# Altium footprint library ACTION_排针排座.PcbLib: 121 footprints (part 4 of 8)
Each footprint in its own frame and in the unit in brackets; x right, y up, seen from the top. Pads: shape width x height; smd on the part's side, far side on the other; paste and mask are expansions set on the pad; w line width, h text height; cw(c..) or ccw(c..) is an arc to the next point about the centre after c.
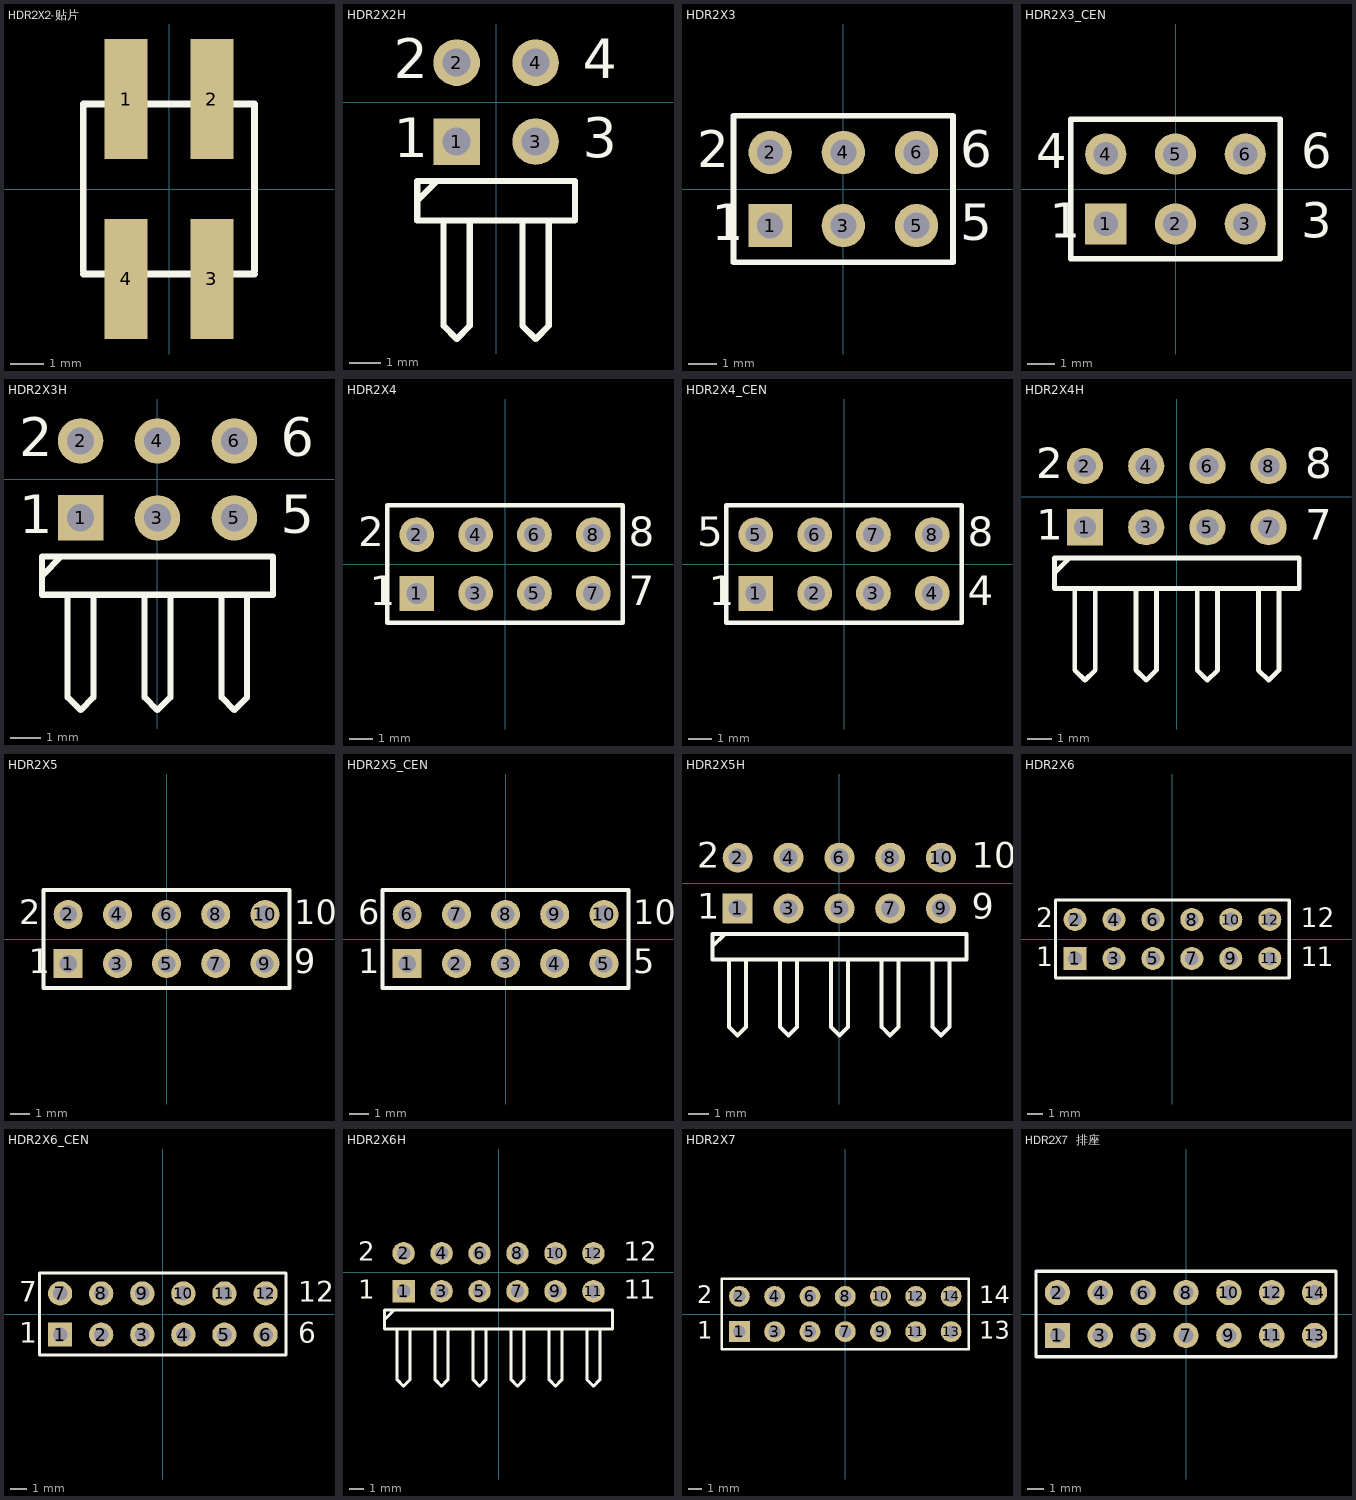
[diagram p3: the footprints below, top view; thin cyan lines are the x and y axes]

## HDR2X2-贴片 [mil]
pads (4):
  rect 50x140 smd: 1(-50,105) 2(50,105) 3(50,-105) 4(-50,-105)
Top Overlay:
  lines w7.87: -100.18,-99.24 99.82,-99.24 ; -100.18,-95.31 -100.18,4.69 ; -100.18,-0.82 -100.18,99.18 99.82,99.18 99.82,-0.82 ; 99.82,-95.31 99.82,4.69

## HDR2X2H [mm] "Connector; Header; 2x2 Position; Right Angle"
pads (4):
  rect 1.5x1.5 hole 0.9: 1(-1.27,-1.27)
  round 1.5 hole 0.9: 2(-1.27,1.27) 3(1.27,-1.27) 4(1.27,1.27)
Top Overlay:
  lines w0.2: -2.54,-3.175 -1.905,-2.54 ; -1.693,-3.81 -1.693,-7.197 -1.27,-7.62 -0.847,-7.197 -0.847,-3.81 ; 0.847,-3.81 0.847,-7.197 1.27,-7.62 1.693,-7.197 1.693,-3.81 ; -2.54,-3.81 2.54,-3.81 2.54,-2.54 -2.54,-2.54 -2.54,-3.81
  text "3" at 2.794,-1.778 h1.27
  text "4" at 2.794,0.762 h1.27
  text "2" at -3.302,0.762 h1.27
  text "1" at -3.302,-1.778 h1.27
3D body "12580.stp": height 5.55, standoff -3.22, extent -2.565,-11.831 2.515,1.524

## HDR2X3 [mm] "Connector; Header; 3x2 Position"
pads (6):
  rect 1.5x1.5 hole 0.9: 1(-2.54,-1.27)
  round 1.5 hole 0.9: 2(-2.54,1.27) 3(0,-1.27) 4(0,1.27) 5(2.54,-1.27) 6(2.54,1.27)
Top Overlay:
  lines w0.2: -1.058,-2.54 3.81,-2.54 ; 3.81,-2.54 -3.81,-2.54 -3.81,2.54 3.81,2.54 3.81,-2.54
  text "1" at -4.572,-1.778 h1.27
  text "2" at -5.08,0.762 h1.27
  text "5" at 4.064,-1.778 h1.27
  text "6" at 4.064,0.762 h1.27
3D body "HEADER 3X2.STEP": height 10.1, standoff -1.5, extent -3.835,-2.54 3.785,2.54

## HDR2X3_CEN [mm] "Connector; Header; 3x2 Position"
pads (6):
  rect 1.5x1.5 hole 0.9: 1(-2.54,-1.27)
  round 1.5 hole 0.9: 2(0,-1.27) 3(2.54,-1.27) 4(-2.54,1.27) 5(0,1.27) 6(2.54,1.27)
Top Overlay:
  lines w0.2: -3.81,-2.54 3.81,-2.54 3.81,2.54 -3.81,2.54 -3.81,-2.54
  text "6" at 4.572,0.762 h1.27
  text "3" at 4.572,-1.778 h1.27
  text "1" at -4.572,-1.778 h1.27
  text "4" at -5.08,0.762 h1.27
3D body "HEADER 3X2.STEP": height 10.1, standoff -1.5, extent -3.81,-2.54 3.81,2.54

## HDR2X3H [mm] "Connector; Header; 3x2 Position; Right Angle"
pads (6):
  rect 1.5x1.5 hole 0.9: 1(-2.54,-1.27)
  round 1.5 hole 0.9: 2(-2.54,1.27) 3(0,-1.27) 4(0,1.27) 5(2.54,-1.27) 6(2.54,1.27)
Top Overlay:
  lines w0.2: -3.81,-3.175 -3.175,-2.54 ; -2.963,-3.81 -2.963,-7.197 -2.54,-7.62 -2.117,-7.197 -2.117,-3.81 ; -0.423,-3.81 -0.423,-7.197 0,-7.62 0.423,-7.197 0.423,-3.81 ; 2.117,-3.81 2.117,-7.197 2.54,-7.62 2.963,-7.197 2.963,-3.81 ; -3.81,-3.81 3.81,-3.81 3.81,-2.54 -3.81,-2.54 -3.81,-3.81
  text "2" at -4.572,0.762 h1.27
  text "1" at -4.572,-1.778 h1.27
  text "5" at 4.064,-1.778 h1.27
  text "6" at 4.064,0.762 h1.27
3D body "12581.stp": height 5.55, standoff -3.22, extent -3.708,-11.881 3.912,1.474

## HDR2X4 [mm] "Connector; Header; 4x2 Position"
pads (8):
  rect 1.5x1.5 hole 0.9: 1(-3.81,-1.27)
  round 1.5 hole 0.9: 2(-3.81,1.27) 3(-1.27,-1.27) 4(-1.27,1.27) 5(1.27,-1.27) 6(1.27,1.27) 7(3.81,-1.27) 8(3.81,1.27)
Top Overlay:
  lines w0.2: -5.08,-2.54 5.08,-2.54 5.08,2.54 -5.08,2.54 -5.08,-2.54
  text "2" at -6.35,0.762 h1.27
  text "1" at -5.842,-1.778 h1.27
  text "7" at 5.334,-1.778 h1.27
  text "8" at 5.334,0.762 h1.27
3D body "HEADER 4X2.STEP": height 10.1, standoff -1.5, extent -5.055,-2.54 5.105,2.54

## HDR2X4_CEN [mm] "Connector; Header; 4x2 Position"
pads (8):
  rect 1.5x1.5 hole 0.9: 1(-3.81,-1.27)
  round 1.5 hole 0.9: 2(-1.27,-1.27) 3(1.27,-1.27) 4(3.81,-1.27) 5(-3.81,1.27) 6(-1.27,1.27) 7(1.27,1.27) 8(3.81,1.27)
Top Overlay:
  lines w0.2: -5.08,-2.54 5.08,-2.54 5.08,2.54 -5.08,2.54 -5.08,-2.54
  text "5" at -6.35,0.762 h1.27
  text "1" at -5.842,-1.778 h1.27
  text "4" at 5.334,-1.778 h1.27
  text "8" at 5.334,0.762 h1.27
3D body "HEADER 4X2.STEP": height 10.1, standoff -1.5, extent -5.105,-2.54 5.055,2.54

## HDR2X4H [mm] "Connector; Header; 4x2 Position; Right Angle"
pads (8):
  rect 1.5x1.5 hole 0.9: 1(-3.81,-1.27)
  round 1.5 hole 0.9: 2(-3.81,1.27) 3(-1.27,-1.27) 4(-1.27,1.27) 5(1.27,-1.27) 6(1.27,1.27) 7(3.81,-1.27) 8(3.81,1.27)
Top Overlay:
  lines w0.2: -5.08,-3.175 -4.445,-2.54 ; -4.233,-3.81 -4.233,-7.197 -3.81,-7.62 -3.387,-7.197 -3.387,-3.81 ; -1.693,-3.81 -1.693,-7.197 -1.27,-7.62 -0.847,-7.197 -0.847,-3.81 ; 0.847,-3.81 0.847,-7.197 1.27,-7.62 1.693,-7.197 1.693,-3.81 ; 3.387,-3.81 3.387,-7.197 3.81,-7.62 4.233,-7.197 4.233,-3.81 ; -5.08,-3.81 5.08,-3.81 5.08,-2.54 -5.08,-2.54 -5.08,-3.81
  text "2" at -5.842,0.762 h1.27
  text "1" at -5.842,-1.778 h1.27
  text "7" at 5.334,-1.778 h1.27
  text "8" at 5.334,0.762 h1.27
3D body "12582.stp": height 6.71, standoff -6.65, extent -5.055,-6.265 5.105,2.505

## HDR2X5 [mm] "Connector; Header; 5x2 Position"
pads (10):
  rect 1.5x1.5 hole 0.9: 1(-5.08,-1.27)
  round 1.5 hole 0.9: 2(-5.08,1.27) 3(-2.54,-1.27) 4(-2.54,1.27) 5(0,-1.27) 6(0,1.27) 7(2.54,-1.27) 8(2.54,1.27) 9(5.08,-1.27) 10(5.08,1.27)
Top Overlay:
  lines w0.2: -6.35,-2.54 6.35,-2.54 6.35,2.54 -6.35,2.54 -6.35,-2.54
  text "10" at 6.604,0.762 h1.27
  text "9" at 6.604,-1.778 h1.27
  text "1" at -7.112,-1.778 h1.27
  text "2" at -7.62,0.762 h1.27
3D body "HEADER 5X2.STEP": height 10.1, standoff -1.5, extent -6.35,-2.515 6.35,2.565

## HDR2X5_CEN [mm] "Connector; Header; 5x2 Position"
pads (10):
  rect 1.5x1.5 hole 0.9: 1(-5.08,-1.27)
  round 1.5 hole 0.9: 2(-2.54,-1.27) 3(0,-1.27) 4(2.54,-1.27) 5(5.08,-1.27) 6(-5.08,1.27) 7(-2.54,1.27) 8(0,1.27) 9(2.54,1.27) 10(5.08,1.27)
Top Overlay:
  lines w0.2: -6.35,-2.54 6.35,-2.54 6.35,2.54 -6.35,2.54 -6.35,-2.54
  text "1" at -7.62,-1.778 h1.27
  text "5" at 6.604,-1.778 h1.27
  text "10" at 6.604,0.762 h1.27
  text "6" at -7.62,0.762 h1.27
3D body "HEADER 5X2.STEP": height 10.1, standoff -1.5, extent -6.35,-2.54 6.35,2.54

## HDR2X5H [mm] "Connector; Header; 5x2 Position; Right Angle"
pads (10):
  rect 1.5x1.5 hole 0.9: 1(-5.08,-1.27)
  round 1.5 hole 0.9: 2(-5.08,1.27) 3(-2.54,-1.27) 4(-2.54,1.27) 5(0,-1.27) 6(0,1.27) 7(2.54,-1.27) 8(2.54,1.27) 9(5.08,-1.27) 10(5.08,1.27)
Top Overlay:
  lines w0.2: -6.35,-3.175 -5.715,-2.54 ; -5.503,-3.81 -5.503,-7.197 -5.08,-7.62 -4.657,-7.197 -4.657,-3.81 ; -2.963,-3.81 -2.963,-7.197 -2.54,-7.62 -2.117,-7.197 -2.117,-3.81 ; -0.423,-3.81 -0.423,-7.197 0,-7.62 0.423,-7.197 0.423,-3.81 ; 2.117,-3.81 2.117,-7.197 2.54,-7.62 2.963,-7.197 2.963,-3.81 ; 4.657,-3.81 4.657,-7.197 5.08,-7.62 5.503,-7.197 5.503,-3.81 ; -6.35,-3.81 6.35,-3.81 6.35,-2.54 -6.35,-2.54 -6.35,-3.81
  text "2" at -7.112,0.762 h1.27
  text "1" at -7.112,-1.778 h1.27
  text "9" at 6.604,-1.778 h1.27
  text "10" at 6.604,0.762 h1.27
3D body "12583.stp": height 2.46, standoff -6.31, extent -6.401,-11.78 6.299,1.575

## HDR2X6 [mm] "Connector; Header; 6x2 Position"
pads (12):
  rect 1.5x1.5 hole 0.9: 1(-6.35,-1.27)
  round 1.5 hole 0.9: 2(-6.35,1.27) 3(-3.81,-1.27) 4(-3.81,1.27) 5(-1.27,-1.27) 6(-1.27,1.27) 7(1.27,-1.27) 8(1.27,1.27) 9(3.81,-1.27) 10(3.81,1.27) 11(6.35,-1.27) 12(6.35,1.27)
Top Overlay:
  lines w0.2: -7.62,-2.54 7.62,-2.54 7.62,2.54 -7.62,2.54 -7.62,-2.54
  text "12" at 8.382,0.762 h1.27
  text "1" at 9.398,-1.778 h1.27
  text "1" at 8.382,-1.778 h1.27
  text "1" at -8.89,-1.778 h1.27
  text "2" at -8.89,0.762 h1.27
3D body "HEADER 6X2.STEP": height 10.1, standoff -1.5, extent -7.645,-2.54 7.595,2.54

## HDR2X6_CEN [mm] "Connector; Header; 6x2 Position"
pads (12):
  rect 1.5x1.5 hole 0.9: 1(-6.35,-1.27)
  round 1.5 hole 0.9: 2(-3.81,-1.27) 3(-1.27,-1.27) 4(1.27,-1.27) 5(3.81,-1.27) 6(6.35,-1.27) 7(-6.35,1.27) 8(-3.81,1.27) 9(-1.27,1.27) 10(1.27,1.27) 11(3.81,1.27) 12(6.35,1.27)
Top Overlay:
  lines w0.2: -7.62,-2.54 -7.62,2.54 7.62,2.54 7.62,-2.54 -7.62,-2.54
  text "7" at -8.89,0.762 h1.27
  text "1" at -8.89,-1.778 h1.27
  text "6" at 8.382,-1.778 h1.27
  text "12" at 8.382,0.762 h1.27
3D body "HEADER 6X2.STEP": height 10.1, standoff -1.5, extent -7.645,-2.54 7.595,2.54

## HDR2X6H [mm] "Connector; Header; 6x2 Position; Right Angle"
pads (12):
  rect 1.5x1.5 hole 0.9: 1(-6.35,-1.27)
  round 1.5 hole 0.9: 2(-6.35,1.27) 3(-3.81,-1.27) 4(-3.81,1.27) 5(-1.27,-1.27) 6(-1.27,1.27) 7(1.27,-1.27) 8(1.27,1.27) 9(3.81,-1.27) 10(3.81,1.27) 11(6.35,-1.27) 12(6.35,1.27)
Top Overlay:
  lines w0.2: -7.62,-3.175 -6.985,-2.54 ; -6.773,-3.81 -6.773,-7.197 -6.35,-7.62 -5.927,-7.197 -5.927,-3.81 ; -4.233,-3.81 -4.233,-7.197 -3.81,-7.62 -3.387,-7.197 -3.387,-3.81 ; -1.693,-3.81 -1.693,-7.197 -1.27,-7.62 -0.847,-7.197 -0.847,-3.81 ; 0.847,-3.81 0.847,-7.197 1.27,-7.62 1.693,-7.197 1.693,-3.81 ; 3.387,-3.81 3.387,-7.197 3.81,-7.62 4.233,-7.197 4.233,-3.81 ; 5.927,-3.81 5.927,-7.197 6.35,-7.62 6.773,-7.197 6.773,-3.81 ; -7.62,-3.81 7.62,-3.81 7.62,-2.54 -7.62,-2.54 -7.62,-3.81
  text "2" at -9.398,0.762 h1.27
  text "1" at -9.398,-1.778 h1.27
  text "1" at 8.382,-1.778 h1.27
  text "1" at 9.398,-1.778 h1.27
  text "12" at 8.382,0.762 h1.27
3D body "65801.stp": height 5.08, standoff -3, extent -7.645,-11.334 7.595,1.566

## HDR2X7 [mm] "Connector; Header; 7x2 Position"
pads (14):
  rect 1.5x1.5 hole 0.9: 1(-7.62,-1.27)
  round 1.5 hole 0.9: 2(-7.62,1.27) 3(-5.08,-1.27) 4(-5.08,1.27) 5(-2.54,-1.27) 6(-2.54,1.27) 7(0,-1.27) 8(0,1.27) 9(2.54,-1.27) 10(2.54,1.27) 11(5.08,-1.27) 12(5.08,1.27) 13(7.62,-1.27) 14(7.62,1.27)
Top Overlay:
  lines w0.2: -8.89,-2.54 8.89,-2.54 8.89,2.54 -8.89,2.54 -8.89,-2.54
  text "13" at 9.652,-1.778 h1.27
  text "14" at 9.652,0.762 h1.27
  text "1" at -10.668,-1.778 h1.27
  text "2" at -10.668,0.762 h1.27
3D body "HEADER 7X2.STEP": height 10.1, standoff -1.5, extent -8.865,-2.54 8.915,2.54

## HDR2X7  排座 [mm] "Connector; Header; 7x2 Position"
pads (14):
  rect 1.5x1.5 hole 0.9: 1(-7.62,-1.27)
  round 1.5 hole 0.9: 2(-7.62,1.27) 3(-5.08,-1.27) 4(-5.08,1.27) 5(-2.54,-1.27) 6(-2.54,1.27) 7(0,-1.27) 8(0,1.27) 9(2.54,-1.27) 10(2.54,1.27) 11(5.08,-1.27) 12(5.08,1.27) 13(7.62,-1.27) 14(7.62,1.27)
Top Overlay:
  lines w0.2: -8.89,-2.54 8.89,-2.54 8.89,2.54 -8.89,2.54 -8.89,-2.54
3D body "pcb_connector_803-87-014-65-410101.stp": height 7, standoff -2.8, extent -8.89,-2.54 8.89,2.54